# Altium footprint library 封装库.PcbLib: 755 footprints (part 45 of 48)
Each footprint in its own frame and in the unit in brackets; x right, y up, seen from the top. Pads: shape width x height; smd on the part's side, far side on the other; paste and mask are expansions set on the pad; w line width, h text height; cw(c..) or ccw(c..) is an arc to the next point about the centre after c.
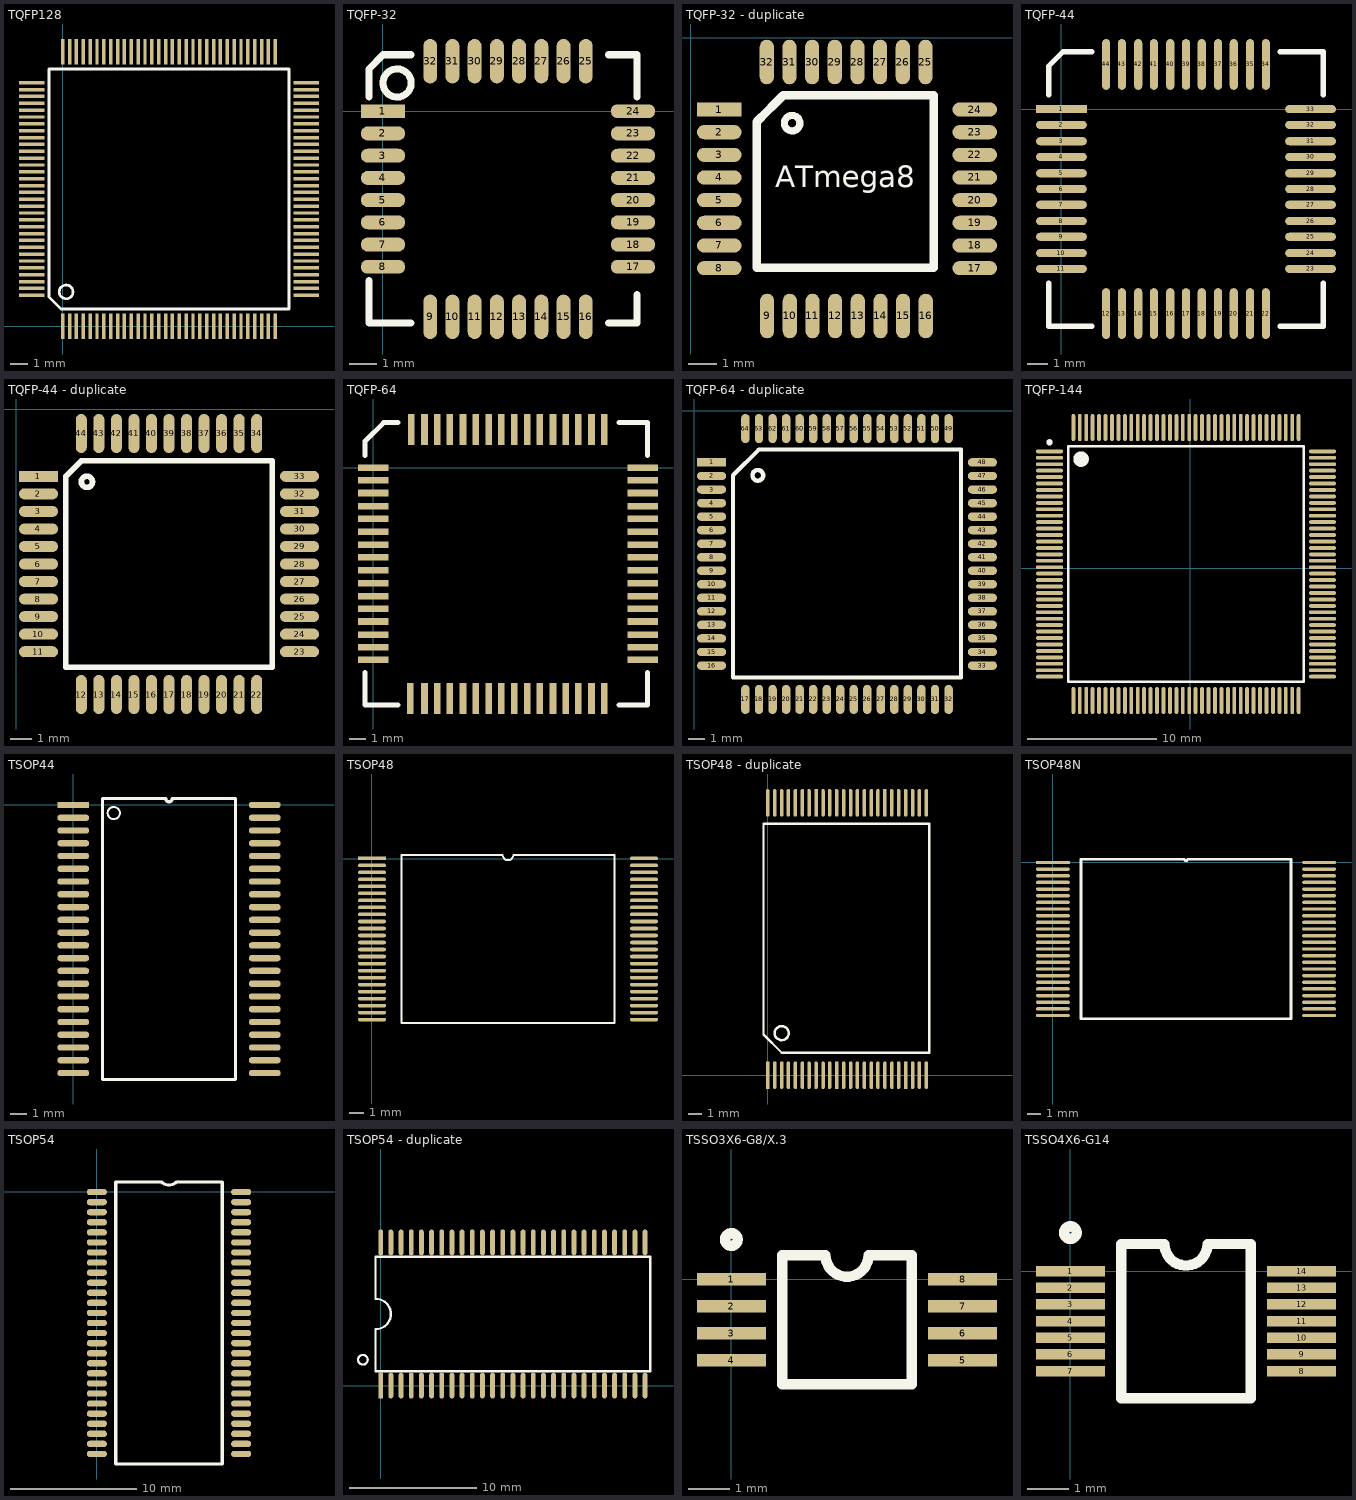
[diagram p44: the footprints below, top view; thin cyan lines are the x and y axes]

## TQFP128 [mm]
pads (128):
  rect 0.203x1.5 smd: 1(0,0) 2(0.4,0) 3(0.8,0) 4(1.2,0) 5(1.6,0) 6(2,0) 7(2.4,0) 8(2.8,0) 9(3.2,0) 10(3.6,0) 11(4,0) 12(4.4,0) 13(4.8,0) 14(5.2,0) 15(5.6,0) 16(6,0) 17(6.4,0) 18(6.8,0) 19(7.2,0) 20(7.6,0) 21(8,0) 22(8.4,0) 23(8.8,0) 24(9.2,0) 25(9.6,0) 26(10,0) 27(10.4,0) 28(10.8,0) 29(11.2,0) 30(11.6,0) 31(12,0) 32(12.4,0) 65(12.4,16) 66(12,16) 67(11.6,16) 68(11.2,16) 69(10.8,16) 70(10.4,16) 71(10,16) 72(9.6,16) 73(9.2,16) 74(8.8,16) 75(8.4,16) 76(8,16) 77(7.6,16) 78(7.2,16) 79(6.8,16) 80(6.4,16) 81(6,16) 82(5.6,16) 83(5.2,16) 84(4.8,16) 85(4.4,16) 86(4,16) 87(3.6,16) 88(3.2,16) 89(2.8,16) 90(2.4,16) 91(2,16) 92(1.6,16) 93(1.2,16) 94(0.8,16) 95(0.4,16) 96(0,16)
  rect 1.5x0.203 smd: 33(14.2,1.8) 34(14.2,2.2) 35(14.2,2.6) 36(14.2,3) 37(14.2,3.4) 38(14.2,3.8) 39(14.2,4.2) 40(14.2,4.6) 41(14.2,5) 42(14.2,5.4) 43(14.2,5.8) 44(14.2,6.2) 45(14.2,6.6) 46(14.2,7) 47(14.2,7.4) 48(14.2,7.8) 49(14.2,8.2) 50(14.2,8.6) 51(14.2,9) 52(14.2,9.4) 53(14.2,9.8) 54(14.2,10.2) 55(14.2,10.6) 56(14.2,11) 57(14.2,11.4) 58(14.2,11.8) 59(14.2,12.2) 60(14.2,12.6) 61(14.2,13) 62(14.2,13.4) 63(14.2,13.8) 64(14.2,14.2) 97(-1.8,14.2) 98(-1.8,13.8) 99(-1.8,13.4) 100(-1.8,13) 101(-1.8,12.6) 102(-1.8,12.2) 103(-1.8,11.8) 104(-1.8,11.4) 105(-1.8,11) 106(-1.8,10.6) 107(-1.8,10.2) 108(-1.8,9.8) 109(-1.8,9.4) 110(-1.8,9) 111(-1.8,8.6) 112(-1.8,8.2) 113(-1.8,7.8) 114(-1.8,7.4) 115(-1.8,7) 116(-1.8,6.6) 117(-1.8,6.2) 118(-1.8,5.8) 119(-1.8,5.4) 120(-1.8,5) 121(-1.8,4.6) 122(-1.8,4.2) 123(-1.8,3.8) 124(-1.8,3.4) 125(-1.8,3) 126(-1.8,2.6) 127(-1.8,2.2) 128(-1.8,1.8)
Top Overlay:
  circle w0.15: c0.2,2 r0.4
  lines w0.15: -0.8,1.7 -0.2,1.1 -0.1,1 13.2,1 13.2,15 -0.8,15 -0.8,1.7

## TQFP-32 [mm]
pads (32):
  rect 1.6x0.5 smd: 1(0,0)
  oval 1.6x0.5 smd: 2(0,-0.8) 3(0,-1.6) 4(0,-2.4) 5(0,-3.2) 6(0,-4) 7(0,-4.8) 8(0,-5.6) 17(9,-5.6) 18(9,-4.8) 19(9,-4) 20(9,-3.2) 21(9,-2.4) 22(9,-1.6) 23(9,-0.8) 24(9,0)
  oval 0.5x1.6 smd: 9(1.7,-7.4) 10(2.5,-7.4) 11(3.3,-7.4) 12(4.1,-7.4) 13(4.9,-7.4) 14(5.7,-7.4) 15(6.5,-7.4) 16(7.3,-7.4) 25(7.3,1.8) 26(6.5,1.8) 27(5.7,1.8) 28(4.9,1.8) 29(4.1,1.8) 30(3.3,1.8) 31(2.5,1.8) 32(1.7,1.8)
Top Overlay:
  circle w0.254: c0.508,1.016 r0.508
  lines w0.254: -0.508,-7.112 -0.508,-6.096 ; -0.508,-6.604 -0.508,-7.62 1.016,-7.62 ; -0.508,0.508 -0.508,1.524 0,2.032 0.508,2.032 1.016,2.032 ; 8.128,-7.62 9.144,-7.62 9.144,-6.604 ; 8.128,2.032 9.144,2.032 9.144,0.508

## TQFP-32 - duplicate [mil]
pads (32):
  rect 62x19.68 smd: 1(40,-100)
  oval 62x19.68 smd: 2(40,-131.5) 3(40,-162.99) 4(40,-194.49) 5(40,-225.98) 6(40,-257.48) 7(40,-288.98) 8(40,-320.47) 17(395,-320.47) 18(395,-288.98) 19(395,-257.48) 20(395,-225.98) 21(395,-194.49) 22(395,-162.99) 23(395,-131.5) 24(395,-100)
  oval 19.68x62 smd: 9(106.51,-387) 10(138.01,-387) 11(169.5,-387) 12(201,-387) 13(232.5,-387) 14(263.99,-387) 15(295.49,-387) 16(326.98,-387) 25(326.52,-33.95) 26(295.02,-33.95) 27(263.53,-33.95) 28(232.03,-33.95) 29(200.53,-33.95) 30(169.04,-33.95) 31(137.54,-33.95) 32(106.05,-33.95)
Top Overlay:
  circle w10: c141.23,-119 r10.77
  lines w12: 93,-116 129,-80 338,-80 338,-320 92,-320 92,-117 98.99,-110.01
  text "ATmega8" at 118,-208 h30

## TQFP-44 [mil]
pads (44):
  rect 100x16 smd: 1(0,0)
  oval 100x16 smd: 2(0,-31) 3(0,-63) 4(0,-94) 5(0,-126) 6(0,-157) 7(0,-188) 8(0,-220) 9(0,-251) 10(0,-283) 11(0,-314) 23(490,-314) 24(490,-283) 25(490,-251) 26(490,-220) 27(490,-188) 28(490,-157) 29(490,-126) 30(490,-94) 31(490,-63) 32(490,-31) 33(490,0)
  oval 16x100 smd: 12(88,-402) 13(119,-402) 14(151,-402) 15(182,-402) 16(214,-402) 17(245,-402) 18(276,-402) 19(308,-402) 20(339,-402) 21(371,-402) 22(402,-402) 34(402,88) 35(371,88) 36(339,88) 37(308,88) 38(276,88) 39(245,88) 40(214,88) 41(182,88) 42(151,88) 43(119,88) 44(88,88)
Top Overlay:
  lines w10: -25,-342 -25,-427 60,-427 ; -25,28 -25,85 3,113 60,113 ; 430,-427 515,-427 515,-342 ; 430,113 515,113 515,28

## TQFP-44 - duplicate [mil]
pads (44):
  rect 70x19.68 smd: 1(40,-120)
  oval 70x19.68 smd: 2(40,-151.5) 3(40,-182.99) 4(40,-214.49) 5(40,-245.98) 6(40,-277.48) 7(40,-308.98) 8(40,-340.47) 9(40,-371.97) 10(40,-403.46) 11(40,-434.96) 23(508.5,-434.96) 24(508.5,-403.46) 25(508.5,-371.97) 26(508.5,-340.47) 27(508.5,-308.98) 28(508.5,-277.48) 29(508.5,-245.98) 30(508.5,-214.49) 31(508.5,-182.99) 32(508.5,-151.5) 33(508.5,-120)
  oval 19.68x70 smd: 12(116.77,-511.73) 13(148.27,-511.73) 14(179.76,-511.73) 15(211.26,-511.73) 16(242.76,-511.73) 17(274.25,-511.73) 18(305.75,-511.73) 19(337.24,-511.73) 20(368.74,-511.73) 21(400.24,-511.73) 22(431.73,-511.73) 34(431.73,-43.23) 35(400.24,-43.23) 36(368.74,-43.23) 37(337.24,-43.23) 38(305.75,-43.23) 39(274.25,-43.23) 40(242.76,-43.23) 41(211.26,-43.23) 42(179.76,-43.23) 43(148.27,-43.23) 44(116.77,-43.23)
Top Overlay:
  circle w10: c126.95,-130 r10.05
  lines w9.84: 89.21,-462.52 459.29,-462.52 459.29,-92.44
  lines w10: 89.21,-462.52 89.21,-120 116.77,-92.44 459.29,-92.44

## TQFP-64 [mil]
pads (64):
  rect 75x16 smd: 1(0,0) 2(0,-31) 3(0,-62) 4(0,-94) 5(0,-125) 6(0,-157) 7(0,-188) 8(0,-219) 9(0,-251) 10(0,-282) 11(0,-314) 12(0,-345) 13(0,-376) 14(0,-408) 15(0,-439) 16(0,-470) 33(658,-469.79) 34(658,-439) 35(658,-408) 36(658,-376) 37(658,-345) 38(658,-314) 39(658,-282) 40(658,-251) 41(658,-219) 42(658,-188) 43(658,-157) 44(658,-125) 45(658,-94) 46(658,-62) 47(658,-31) 48(658,0)
  rect 16x75 smd: 17(90,-564) 18(125,-564) 19(156,-564) 20(187,-564) 21(219,-564) 22(250,-564) 23(282,-564) 24(313,-564) 25(344,-564) 26(376,-564) 27(407,-564) 28(439,-564) 29(470,-564) 30(501,-564) 31(533,-564) 32(564,-564) 49(564,93) 50(533,93) 51(501,93) 52(470,93) 53(439,93) 54(407,93) 55(376,93) 56(344,93) 57(313,93) 58(282,93) 59(250,93) 60(219,93) 61(187,93) 62(156,93) 63(125,93) 64(93,93)
Top Overlay:
  lines w12: -20,-500 -20,-580 60,-580 ; -20,30 -20,65 25,110 60,110 ; 600,-580 670,-580 670,-500 ; 600,110 670,110 670,30

## TQFP-64 - duplicate [mm]
pads (64):
  rect 1.724x0.5 smd: 1(1.016,-3.044)
  oval 1.724x0.5 smd: 2(1.016,-3.844) 3(1.016,-4.644) 4(1.016,-5.444) 5(1.016,-6.244) 6(1.016,-7.044) 7(1.016,-7.844) 8(1.016,-8.644) 9(1.016,-9.444) 10(1.016,-10.244) 11(1.016,-11.044) 12(1.016,-11.844) 13(1.016,-12.644) 14(1.016,-13.444) 15(1.016,-14.244) 16(1.016,-15.044) 33(17.016,-15.044) 34(17.016,-14.244) 35(17.016,-13.444) 36(17.016,-12.644) 37(17.016,-11.844) 38(17.016,-11.044) 39(17.016,-10.244) 40(17.016,-9.444) 41(17.016,-8.644) 42(17.016,-7.844) 43(17.016,-7.044) 44(17.016,-6.244) 45(17.016,-5.444) 46(17.016,-4.644) 47(17.016,-3.844) 48(17.016,-3.044)
  oval 0.5x1.724 smd: 17(3.016,-17.044) 18(3.816,-17.044) 19(4.616,-17.044) 20(5.416,-17.044) 21(6.216,-17.044) 22(7.016,-17.044) 23(7.816,-17.044) 24(8.616,-17.044) 25(9.416,-17.044) 26(10.216,-17.044) 27(11.016,-17.044) 28(11.816,-17.044) 29(12.616,-17.044) 30(13.416,-17.044) 31(14.216,-17.044) 32(15.016,-17.044) 49(15.016,-1.044) 50(14.216,-1.044) 51(13.416,-1.044) 52(12.616,-1.044) 53(11.816,-1.044) 54(11.016,-1.044) 55(10.216,-1.044) 56(9.416,-1.044) 57(8.616,-1.044) 58(7.816,-1.044) 59(7.016,-1.044) 60(6.216,-1.044) 61(5.416,-1.044) 62(4.616,-1.044) 63(3.816,-1.044) 64(3.016,-1.044)
Top Overlay:
  circle w0.254: c3.748,-3.806 r0.316
  lines w0.254: 2.286,-15.744 2.286,-3.806 3.81,-2.282 15.748,-2.282 15.748,-15.744 2.286,-15.744

## TQFP-144 [mm]
pads (144):
  oval 2.1x0.3 smd: 1(-10.913,9.095) 2(-10.913,8.595) 3(-10.913,8.095) 4(-10.913,7.595) 5(-10.913,7.095) 6(-10.913,6.595) 7(-10.913,6.095) 8(-10.913,5.595) 9(-10.913,5.095) 10(-10.913,4.595) 11(-10.913,4.095) 12(-10.913,3.595) 13(-10.913,3.095) 14(-10.913,2.595) 15(-10.913,2.095) 16(-10.913,1.595) 17(-10.913,1.095) 18(-10.913,0.595) 19(-10.913,0.095) 20(-10.913,-0.405) 21(-10.913,-0.905) 22(-10.913,-1.405) 23(-10.913,-1.905) 24(-10.913,-2.405) 25(-10.913,-2.905) 26(-10.913,-3.405) 27(-10.913,-3.905) 28(-10.913,-4.405) 29(-10.913,-4.905) 30(-10.913,-5.405) 31(-10.913,-5.905) 32(-10.913,-6.405) 33(-10.913,-6.905) 34(-10.913,-7.405) 35(-10.913,-7.905) 36(-10.913,-8.405) 73(10.287,-8.405) 74(10.287,-7.905) 75(10.287,-7.405) 76(10.287,-6.905) 77(10.287,-6.405) 78(10.287,-5.905) 79(10.287,-5.405) 80(10.287,-4.905) 81(10.287,-4.405) 82(10.287,-3.905) 83(10.287,-3.405) 84(10.287,-2.905) 85(10.287,-2.405) 86(10.287,-1.905) 87(10.287,-1.405) 88(10.287,-0.905) 89(10.287,-0.405) 90(10.287,0.095) 91(10.287,0.595) 92(10.287,1.095) 93(10.287,1.595) 94(10.287,2.095) 95(10.287,2.595) 96(10.287,3.095) 97(10.287,3.595) 98(10.287,4.095) 99(10.287,4.595) 100(10.287,5.095) 101(10.287,5.595) 102(10.287,6.095) 103(10.287,6.595) 104(10.287,7.095) 105(10.287,7.595) 106(10.287,8.095) 107(10.287,8.595) 108(10.287,9.095)
  oval 0.3x2.1 smd: 37(-9.063,-10.255) 38(-8.563,-10.255) 39(-8.063,-10.255) 40(-7.563,-10.255) 41(-7.063,-10.255) 42(-6.563,-10.255) 43(-6.063,-10.255) 44(-5.563,-10.255) 45(-5.063,-10.255) 46(-4.563,-10.255) 47(-4.063,-10.255) 48(-3.563,-10.255) 49(-3.063,-10.255) 50(-2.563,-10.255) 51(-2.063,-10.255) 52(-1.563,-10.255) 53(-1.063,-10.255) 54(-0.563,-10.255) 55(-0.063,-10.255) 56(0.437,-10.255) 57(0.937,-10.255) 58(1.437,-10.255) 59(1.937,-10.255) 60(2.437,-10.255) 61(2.937,-10.255) 62(3.437,-10.255) 63(3.937,-10.255) 64(4.437,-10.255) 65(4.937,-10.255) 66(5.437,-10.255) 67(5.937,-10.255) 68(6.437,-10.255) 69(6.937,-10.255) 70(7.437,-10.255) 71(7.937,-10.255) 72(8.437,-10.255) 109(8.437,10.945) 110(7.937,10.945) 111(7.437,10.945) 112(6.937,10.945) 113(6.437,10.945) 114(5.937,10.945) 115(5.437,10.945) 116(4.937,10.945) 117(4.437,10.945) 118(3.937,10.945) 119(3.437,10.945) 120(2.937,10.945) 121(2.437,10.945) 122(1.937,10.945) 123(1.437,10.945) 124(0.937,10.945) 125(0.437,10.945) 126(-0.063,10.945) 127(-0.563,10.945) 128(-1.063,10.945) 129(-1.563,10.945) 130(-2.063,10.945) 131(-2.563,10.945) 132(-3.063,10.945) 133(-3.563,10.945) 134(-4.063,10.945) 135(-4.563,10.945) 136(-5.063,10.945) 137(-5.563,10.945) 138(-6.063,10.945) 139(-6.563,10.945) 140(-7.063,10.945) 141(-7.563,10.945) 142(-8.063,10.945) 143(-8.563,10.945) 144(-9.063,10.945)
Top Overlay:
  circle w0.6: c-8.463,8.495 r0.3
  circle w0.25: c-10.913,9.795 r0.125
  lines w0.2: -9.463,-8.805 8.837,-8.805 8.837,9.495 -9.463,9.495 -9.463,-8.805

## TSOP44 [mm]
pads (44):
  rect 2x0.4 smd: 1(0,0)
  oval 2x0.4 smd: 2(0,-0.8) 3(0,-1.6) 4(0,-2.4) 5(0,-3.2) 6(0,-4) 7(0,-4.8) 8(0,-5.6) 9(0,-6.4) 10(0,-7.2) 11(0,-8) 12(0,-8.8) 13(0,-9.6) 14(0,-10.4) 15(0,-11.2) 16(0,-12) 17(0,-12.8) 18(0,-13.6) 19(0,-14.4) 20(0,-15.2) 21(0,-16) 22(0,-16.8) 23(12,-16.8) 24(12,-16) 25(12,-15.2) 26(12,-14.4) 27(12,-13.6) 28(12,-12.8) 29(12,-12) 30(12,-11.2) 31(12,-10.4) 32(12,-9.6) 33(12,-8.8) 34(12,-8) 35(12,-7.2) 36(12,-6.4) 37(12,-5.6) 38(12,-4.8) 39(12,-4) 40(12,-3.2) 41(12,-2.4) 42(12,-1.6) 43(12,-0.8) 44(12,0)
Top Overlay:
  circle w0.127: c2.54,-0.508 r0.381
  lines w0.203: 1.838,-17.2 1.838,0.4 5.8,0.4 ccw(c6,0.4) 6.2,0.4 10.162,0.4 10.162,-17.2 1.838,-17.2

## TSOP48 [mil]
pads (48):
  rect 78.74x10 smd: 1(0.07,0.33)
  oval 78.74x10 smd: 2(0.07,-19.35) 3(0.07,-39.04) 4(0.07,-58.72) 5(0.07,-78.41) 6(0.07,-98.09) 7(0.07,-117.78) 8(0.07,-137.46) 9(0.07,-157.15) 10(0.07,-176.83) 11(0.07,-196.52) 12(0.07,-216.2) 13(0.07,-235.89) 14(0.07,-255.57) 15(0.07,-275.26) 16(0.07,-294.94) 17(0.07,-314.63) 18(0.07,-334.31) 19(0.07,-354) 20(0.07,-373.68) 21(0.07,-393.37) 22(0.07,-413.05) 23(0.07,-432.74) 24(0.07,-452.42) 25(763.85,-452.42) 26(763.85,-432.74) 27(763.85,-413.05) 28(763.85,-393.37) 29(763.85,-373.68) 30(763.85,-354) 31(763.85,-334.31) 32(763.85,-314.63) 33(763.85,-294.94) 34(763.85,-275.26) 35(763.85,-255.57) 36(763.85,-235.89) 37(763.85,-216.2) 38(763.85,-196.52) 39(763.85,-176.83) 40(763.85,-157.15) 41(763.85,-137.46) 42(763.85,-117.78) 43(763.85,-98.09) 44(763.85,-78.41) 45(763.85,-58.72) 46(763.85,-39.04) 47(763.85,-19.35) 48(763.85,0.33)
Top Overlay:
  lines w5.51: 366.04,10.17 82.39,10.17 82.39,-462.27 681.53,-462.27 681.53,10.17 397.88,10.17 ; 366.96,10.17 ccw(c381.96,10.17) 396.96,10.17

## TSOP48 - duplicate [mil]
pads (48):
  rect 10x79 smd: 1(0,0) 11(197,0.02) 21(394,0.02) 31(335,778) 41(138,778.02)
  oval 10x79 smd: 2(20,0.02) 3(40,0.02) 4(59,0.02) 5(79,0.02) 6(99,0.02) 7(118,0.02) 8(138,0.02) 9(158,0.02) 10(177,0) 12(217,0.02) 13(237,0.02) 14(256,0.02) 15(276,0.02) 16(296,0.02) 17(315,0.02) 18(335,0.02) 19(355,0.02) 20(374,0) 22(414,0.02) 23(433,0.02) 24(453,0.02) 25(453,778.02) 26(433,778.02) 27(414,778.02) 28(394,778.02) 29(374,778) 30(354,778) 32(315,778.02) 33(296,778.02) 34(276,778.02) 35(256,778.02) 36(237,778.02) 37(217,778.02) 38(197,778.02) 39(177,778.02) 40(158,778) 42(118,778.02) 43(99,778.02) 44(79,778.02) 45(59,778.02) 46(40,778.02) 47(20,778.02) 48(0,778.02)
Top Overlay:
  circle w7: c40,120 r20
  lines w7: -12,116.02 40,64.02 461,64.02 461,718.02 -12,718.02 -12,116.02

## TSOP48N [mil]
pads (48):
  rect 100x10 smd: 1(0.09,-0.33)
  oval 100x10 smd: 2(0.09,-20.02) 3(0.09,-39.7) 4(0.09,-59.39) 5(0.09,-79.07) 6(0.09,-98.76) 7(0.09,-118.44) 8(0.09,-138.13) 9(0.09,-157.81) 10(0.09,-177.5) 11(0.09,-197.18) 12(0.09,-216.87) 13(0.09,-236.55) 14(0.09,-256.24) 15(0.09,-275.92) 16(0.09,-295.61) 17(0.09,-315.29) 18(0.09,-334.98) 19(0.09,-354.66) 20(0.09,-374.35) 21(0.09,-394.03) 22(0.09,-413.72) 23(0.09,-433.4) 24(0.09,-453.09) 25(787.5,-453.09) 26(787.5,-433.4) 27(787.5,-413.72) 28(787.5,-394.03) 29(787.5,-374.35) 30(787.5,-354.66) 31(787.5,-334.98) 32(787.5,-315.29) 33(787.5,-295.61) 34(787.5,-275.92) 35(787.5,-256.24) 36(787.5,-236.55) 37(787.5,-216.87) 38(787.5,-197.18) 39(787.5,-177.5) 40(787.5,-157.81) 41(787.5,-138.13) 42(787.5,-118.44) 43(787.5,-98.76) 44(787.5,-79.07) 45(787.5,-59.39) 46(787.5,-39.7) 47(787.5,-20.02) 48(787.5,-0.33)
Top Overlay:
  lines w7.87: 82.97,-462.93 704.62,-462.93 704.62,9.51 398.72,9.51 cw(c393.8,9.51) 388.87,9.51 82.97,9.51 82.97,-462.93

## TSOP54 [mm]
pads (54):
  oval 1.6x0.5 smd: 1(0.006,-0.007) 2(0.006,-0.807) 3(0.006,-1.607) 4(0.006,-2.407) 5(0.006,-3.207) 6(0.006,-4.007) 7(0.006,-4.807) 8(0.006,-5.607) 9(0.006,-6.407) 10(0.006,-7.207) 11(0.006,-8.007) 12(0.006,-8.807) 13(0.006,-9.607) 14(0.006,-10.407) 15(0.006,-11.207) 16(0.006,-12.007) 17(0.006,-12.807) 18(0.006,-13.607) 19(0.006,-14.407) 20(0.006,-15.207) 21(0.006,-16.007) 22(0.006,-16.807) 23(0.006,-17.607) 24(0.006,-18.407) 25(0.006,-19.207) 26(0.006,-20.007) 27(0.006,-20.807) 28(11.466,-20.807) 29(11.466,-20.007) 30(11.466,-19.207) 31(11.466,-18.407) 32(11.466,-17.607) 33(11.466,-16.807) 34(11.466,-16.007) 35(11.466,-15.207) 36(11.466,-14.407) 37(11.466,-13.607) 38(11.466,-12.807) 39(11.466,-12.007) 40(11.466,-11.207) 41(11.466,-10.407) 42(11.466,-9.607) 43(11.466,-8.807) 44(11.466,-8.007) 45(11.466,-7.207) 46(11.466,-6.407) 47(11.466,-5.607) 48(11.466,-4.807) 49(11.466,-4.007) 50(11.466,-3.207) 51(11.466,-2.407) 52(11.466,-1.607) 53(11.466,-0.807) 54(11.466,-0.007)
Top Overlay:
  lines w0.254: 1.506,-21.607 9.966,-21.607 9.966,0.793 6.327,0.793 cw(c5.736,1.384) 5.145,0.793 1.506,0.793 1.506,-21.607

## TSOP54 - duplicate [mil]
pads (54):
  rect 15x80 smd: 1(0,0)
  oval 15x80 smd: 2(31.5,0) 3(62.99,0) 4(94.49,0) 5(125.98,0) 6(157.48,0) 7(188.98,0) 8(220.47,0) 9(251.97,0) 10(283.47,0) 11(314.96,0) 12(346.46,0) 13(377.95,0) 14(409.45,0) 15(440.94,0) 16(472.44,0) 17(503.94,0) 18(535.43,0) 19(566.93,0) 20(598.43,0) 21(629.92,0) 22(661.42,0) 23(692.91,0) 24(724.41,0) 25(755.91,0) 26(787.4,0) 27(818.9,0) 28(818.9,443.31) 29(787.4,443.31) 30(755.91,443.31) 31(724.41,443.31) 32(692.91,443.31) 33(661.42,443.31) 34(629.92,443.31) 35(598.43,443.31) 36(566.93,443.31) 37(535.43,443.31) 38(503.94,443.31) 39(472.44,443.31) 40(440.94,443.31) 41(409.45,443.31) 42(377.95,443.31) 43(346.46,443.31) 44(314.96,443.31) 45(283.47,443.31) 46(251.97,443.31) 47(220.47,443.31) 48(188.98,443.31) 49(157.48,443.31) 50(125.98,443.31) 51(94.49,443.31) 52(62.99,443.31) 53(31.5,443.31) 54(0,443.31)
Top Overlay:
  circle w7: c-55.31,80 r15
  lines w7: -15.75,173.78 -15.75,44.37 834.65,44.37 834.65,398.94 -15.75,398.94 -15.75,269.53 ; -15.75,174.41 ccw(c-15.75,221.65) -15.75,268.9

## TSSO3X6-G8/X.3 [mm]
pads (8):
  rect 1.65x0.3 smd: 1(0,0) 2(0,-0.65) 3(0,-1.3) 4(0,-1.95) 5(5.55,-1.95) 6(5.55,-1.3) 7(5.55,-0.65) 8(5.55,0)
Top Overlay:
  circle w0.25: c0,0.95 r0.15
  lines w0.25: 1.225,-2.525 4.325,-2.525 4.325,0.575 3.292,0.575 cw(c2.775,0.575) 2.258,0.575 1.225,0.575 1.225,-2.525

## TSSO4X6-G14 [mm]
pads (14):
  rect 1.65x0.25 smd: 1(0,0) 2(0,-0.4) 3(0,-0.8) 4(0,-1.2) 5(0,-1.6) 6(0,-2) 7(0,-2.4) 8(5.55,-2.4) 9(5.55,-2) 10(5.55,-1.6) 11(5.55,-1.2) 12(5.55,-0.8) 13(5.55,-0.4) 14(5.55,0)
Top Overlay:
  circle w0.25: c0,0.925 r0.15
  lines w0.25: 1.225,-3.05 4.325,-3.05 4.325,0.65 3.292,0.65 cw(c2.775,0.65) 2.258,0.65 1.225,0.65 1.225,-3.05